# Altium footprint library WE-SHC.PcbLib: 139 footprints (part 3 of 10)
Each footprint in its own frame and in the unit in brackets; x right, y up, seen from the top. Pads: shape width x height; smd on the part's side, far side on the other; paste and mask are expansions set on the pad; w line width, h text height; cw(c..) or ccw(c..) is an arc to the next point about the centre after c.
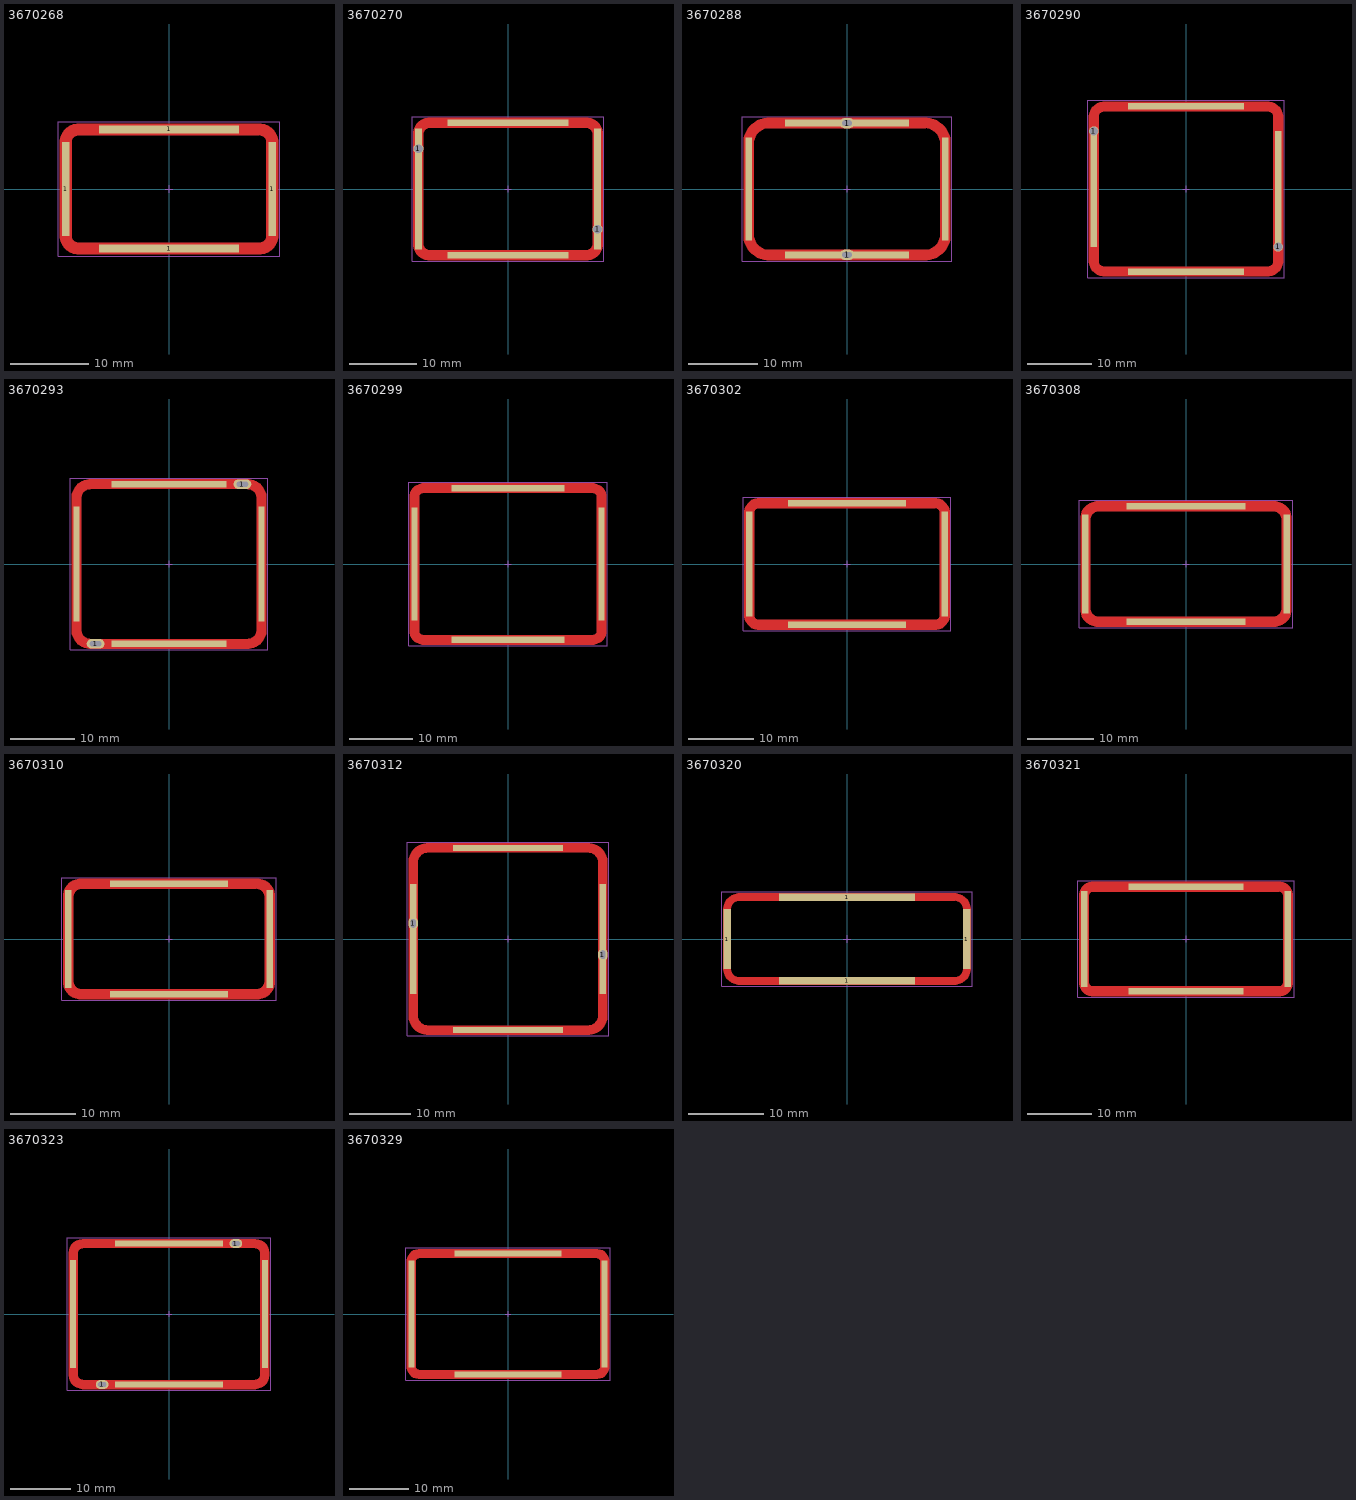
[diagram p2: the footprints below, top view; thin cyan lines are the x and y axes]

## 3670268 [mm] "Shielding Cabinet, SMT Frame Seamless, 26.8x15.6x2.5mm"
height 2.5
pads (4):
  rect 1x12 smd paste-2539.97 mask-2222: 1(-13.25,0) 1(13.25,0)
  rect 18x1 smd paste-2539.97 mask-2222: 1(0,-7.65) 1(0,7.65)
Top Layer:
  region: -14,-0.25 -14,-6 -14,-6.236 -13.908,-6.7 -13.727,-7.137 -13.464,-7.53 -13.13,-7.864 -12.737,-8.127 -12.3,-8.308 -11.836,-8.4 -11.6,-8.4 11.6,-8.4 11.836,-8.4 12.3,-8.308 12.737,-8.127 13.13,-7.864 13.464,-7.53 13.727,-7.137 13.908,-6.7 14,-6.236 14,-6 14,-0.25 12.5,-0.25 12.5,-6 12.496,-6.088 12.461,-6.261 12.394,-6.424 12.296,-6.571 12.171,-6.696 12.024,-6.794 11.861,-6.861 11.688,-6.896 11.6,-6.9 -11.6,-6.9 -11.688,-6.896 -11.861,-6.861 -12.024,-6.794 -12.171,-6.696 -12.296,-6.571 -12.394,-6.424 -12.461,-6.261 -12.496,-6.088 -12.5,-6 -12.5,-0.25
  region: -14,-1 -14,6 -14,6.236 -13.908,6.7 -13.727,7.137 -13.464,7.53 -13.13,7.864 -12.737,8.127 -12.3,8.308 -11.836,8.4 -11.6,8.4 11.6,8.4 11.836,8.4 12.3,8.308 12.737,8.127 13.13,7.864 13.464,7.53 13.727,7.137 13.908,6.7 14,6.236 14,6 14,-1 12.5,-1 12.5,6 12.496,6.088 12.461,6.261 12.394,6.424 12.296,6.571 12.171,6.696 12.024,6.794 11.861,6.861 11.688,6.896 11.6,6.9 -11.6,6.9 -11.688,6.896 -11.861,6.861 -12.024,6.794 -12.171,6.696 -12.296,6.571 -12.394,6.424 -12.461,6.261 -12.496,6.088 -12.5,6 -12.5,-1
Top Paste:
  region: -14,0.25 -14,6 -14,6.236 -13.908,6.7 -13.727,7.137 -13.464,7.53 -13.13,7.864 -12.737,8.127 -12.3,8.308 -11.836,8.4 -11.6,8.4 11.6,8.4 11.836,8.4 12.3,8.308 12.737,8.127 13.13,7.864 13.464,7.53 13.727,7.137 13.908,6.7 14,6.236 14,6 14,0.25 12.5,0.25 12.5,6 12.496,6.088 12.461,6.261 12.394,6.424 12.296,6.571 12.171,6.696 12.024,6.794 11.861,6.861 11.688,6.896 11.6,6.9 -11.6,6.9 -11.688,6.896 -11.861,6.861 -12.024,6.794 -12.171,6.696 -12.296,6.571 -12.394,6.424 -12.461,6.261 -12.496,6.088 -12.5,6 -12.5,0.25
  region: -14,-0.25 -14,-6 -14,-6.236 -13.908,-6.7 -13.727,-7.137 -13.464,-7.53 -13.13,-7.864 -12.737,-8.127 -12.3,-8.308 -11.836,-8.4 -11.6,-8.4 11.6,-8.4 11.836,-8.4 12.3,-8.308 12.737,-8.127 13.13,-7.864 13.464,-7.53 13.727,-7.137 13.908,-6.7 14,-6.236 14,-6 14,-0.25 12.5,-0.25 12.5,-6 12.496,-6.088 12.461,-6.261 12.394,-6.424 12.296,-6.571 12.171,-6.696 12.024,-6.794 11.861,-6.861 11.688,-6.896 11.6,-6.9 -11.6,-6.9 -11.688,-6.896 -11.861,-6.861 -12.024,-6.794 -12.171,-6.696 -12.296,-6.571 -12.394,-6.424 -12.461,-6.261 -12.496,-6.088 -12.5,-6 -12.5,-0.25
Notes:
  text "recommended tin paste thickness=0.5mm / customer to define the final stencil gap" at -5,-10 h0.4
Top Designator:
  text ".Designator" at -7.498,-0.5 h1.5
Top Component Outline:
  lines w0.1: -13.4,-6.05 ccw(c-11.65,-6.05) -11.65,-7.8 11.65,-7.8 ccw(c11.65,-6.05) 13.4,-6.05 13.4,6.05 ccw(c11.65,6.05) 11.65,7.8 -11.65,7.8 ccw(c-11.65,6.05) -13.4,6.05 -13.4,-6.05
Top 3D Body:
  lines w0.1: -13.4,-6.05 ccw(c-11.65,-6.05) -11.65,-7.8 11.65,-7.8 ccw(c11.65,-6.05) 13.4,-6.05 13.4,6.05 ccw(c11.65,6.05) 11.65,7.8 -11.65,7.8 ccw(c-11.65,6.05) -13.4,6.05 -13.4,-6.05
Top Courtyard:
  lines w0.05: -0.5,0 0.5,0 ; 0,-0.5 0,0.5 ; -14.2,-8.6 14.2,-8.6 14.2,8.6 -14.2,8.6 -14.2,-8.6
3D body "3670268.stp": height 2.5, standoff 0, extent -13.4,-7.8 13.4,7.8

## 3670270 [mm] "Shielding Cabinet, SMT Frame Seamless, 27x20x6mm"
height 6
pads (6):
  rect 1x18 smd paste-2539.97 mask-2222: 1(-13.35,0) 1(13.35,0)
  round 1.5 hole 1.3: 1(-13.35,6) 1(13.35,-6)
  rect 18x1 smd paste-2539.97 mask-2222: 1(0,-9.85) 1(0,9.85)
Top Layer:
  region: -14.1,-8.2 -14.1,8.2 -14.1,8.436 -14.008,8.9 -13.827,9.337 -13.564,9.73 -13.23,10.064 -12.837,10.327 -12.4,10.508 -11.936,10.6 -11.7,10.6 1,10.6 1,9.1 -11.7,9.1 -11.788,9.096 -11.961,9.061 -12.124,8.994 -12.271,8.896 -12.396,8.771 -12.494,8.624 -12.561,8.461 -12.596,8.288 -12.6,8.2 -12.6,-8.2 -12.596,-8.288 -12.561,-8.461 -12.494,-8.624 -12.396,-8.771 -12.271,-8.896 -12.124,-8.994 -11.961,-9.061 -11.788,-9.096 -11.7,-9.1 1,-9.1 1,-10.6 -11.7,-10.6 -11.936,-10.6 -12.4,-10.508 -12.837,-10.327 -13.23,-10.064 -13.564,-9.73 -13.827,-9.337 -14.008,-8.9 -14.1,-8.436
  region: 14.1,-8.2 14.1,8.2 14.1,8.436 14.008,8.9 13.827,9.337 13.564,9.73 13.23,10.064 12.837,10.327 12.4,10.508 11.936,10.6 11.7,10.6 0.25,10.6 0.25,9.1 11.7,9.1 11.788,9.096 11.961,9.061 12.124,8.994 12.271,8.896 12.396,8.771 12.494,8.624 12.561,8.461 12.596,8.288 12.6,8.2 12.6,-8.2 12.596,-8.288 12.561,-8.461 12.494,-8.624 12.396,-8.771 12.271,-8.896 12.124,-8.994 11.961,-9.061 11.788,-9.096 11.7,-9.1 0.25,-9.1 0.25,-10.6 11.7,-10.6 11.936,-10.6 12.4,-10.508 12.837,-10.327 13.23,-10.064 13.564,-9.73 13.827,-9.337 14.008,-8.9 14.1,-8.436
Top Paste:
  region: 14.1,-8.2 14.1,8.2 14.1,8.436 14.008,8.9 13.827,9.337 13.564,9.73 13.23,10.064 12.837,10.327 12.4,10.508 11.936,10.6 11.7,10.6 0.25,10.6 0.25,9.1 11.7,9.1 11.788,9.096 11.961,9.061 12.124,8.994 12.271,8.896 12.396,8.771 12.494,8.624 12.561,8.461 12.596,8.288 12.6,8.2 12.6,-8.2 12.596,-8.288 12.561,-8.461 12.494,-8.624 12.396,-8.771 12.271,-8.896 12.124,-8.994 11.961,-9.061 11.788,-9.096 11.7,-9.1 0.25,-9.1 0.25,-10.6 11.7,-10.6 11.936,-10.6 12.4,-10.508 12.837,-10.327 13.23,-10.064 13.564,-9.73 13.827,-9.337 14.008,-8.9 14.1,-8.436
  region: -14.1,-8.2 -14.1,8.2 -14.1,8.436 -14.008,8.9 -13.827,9.337 -13.564,9.73 -13.23,10.064 -12.837,10.327 -12.4,10.508 -11.936,10.6 -11.7,10.6 -0.25,10.6 -0.25,9.1 -11.7,9.1 -11.788,9.096 -11.961,9.061 -12.124,8.994 -12.271,8.896 -12.396,8.771 -12.494,8.624 -12.561,8.461 -12.596,8.288 -12.6,8.2 -12.6,-8.2 -12.596,-8.288 -12.561,-8.461 -12.494,-8.624 -12.396,-8.771 -12.271,-8.896 -12.124,-8.994 -11.961,-9.061 -11.788,-9.096 -11.7,-9.1 -0.25,-9.1 -0.25,-10.6 -11.7,-10.6 -11.936,-10.6 -12.4,-10.508 -12.837,-10.327 -13.23,-10.064 -13.564,-9.73 -13.827,-9.337 -14.008,-8.9 -14.1,-8.436
Notes:
  text "recommended tin paste thickness=0.5mm / customer to define the final stencil gap" at -5.6,-12.2 h0.4
Top Designator:
  text ".Designator" at -7.498,-0.5 h1.5
Top Component Outline:
  lines w0.1: -13.5,-8.25 ccw(c-11.75,-8.25) -11.75,-10 11.75,-10 ccw(c11.75,-8.25) 13.5,-8.25 13.5,8.25 ccw(c11.75,8.25) 11.75,10 -11.75,10 ccw(c-11.75,8.25) -13.5,8.25 -13.5,-8.25
Top 3D Body:
  lines w0.1: -13.5,-8.25 ccw(c-11.75,-8.25) -11.75,-10 11.75,-10 ccw(c11.75,-8.25) 13.5,-8.25 13.5,8.25 ccw(c11.75,8.25) 11.75,10 -11.75,10 ccw(c-11.75,8.25) -13.5,8.25 -13.5,-8.25
Top Courtyard:
  lines w0.05: -0.5,0 0.5,0 ; 0,-0.5 0,0.5 ; -14.3,-10.8 -14.3,10.8 14.3,10.8 14.3,-10.8 -14.3,-10.8
3D body "3670270.stp": height 6, standoff -1, extent -13.5,-10 13.5,10

## 3670288 [mm] "Shielding Cabinet, SMT Frame Seamless, 28.8x19.4x5mm"
height 5
pads (6):
  rect 1x15 smd paste-2539.97 mask-2222: 1(-14.25,0) 1(14.25,0)
  rect 18x1 smd paste-2539.97 mask-2222: 1(0,-9.55) 1(0,9.55)
  oval 2.1x1.5 hole 0.8 slot 1.4 at 0 deg: 1(0,-9.55) 1(0,9.55)
Top Layer:
  region: -15,-0.25 -15,-6.7 -15,-6.936 -14.938,-7.404 -14.816,-7.86 -14.636,-8.296 -14.4,-8.704 -14.112,-9.079 -13.779,-9.412 -13.404,-9.7 -12.996,-9.936 -12.56,-10.116 -12.104,-10.238 -11.636,-10.3 -11.4,-10.3 11.4,-10.3 11.636,-10.3 12.104,-10.238 12.56,-10.116 12.996,-9.936 13.404,-9.7 13.779,-9.412 14.112,-9.079 14.4,-8.704 14.636,-8.296 14.816,-7.86 14.938,-7.404 15,-6.936 15,-6.7 15,-0.25 13.5,-0.25 13.5,-6.7 13.49,-6.906 13.41,-7.31 13.252,-7.69 13.023,-8.032 12.732,-8.323 12.39,-8.552 12.01,-8.71 11.606,-8.79 11.4,-8.8 -11.4,-8.8 -11.606,-8.79 -12.01,-8.71 -12.39,-8.552 -12.732,-8.323 -13.023,-8.032 -13.252,-7.69 -13.41,-7.31 -13.49,-6.906 -13.5,-6.7 -13.5,-0.25
  region: -15,-1 -15,6.7 -15,6.936 -14.938,7.404 -14.816,7.86 -14.636,8.296 -14.4,8.704 -14.112,9.079 -13.779,9.412 -13.404,9.7 -12.996,9.936 -12.56,10.116 -12.104,10.238 -11.636,10.3 -11.4,10.3 11.4,10.3 11.636,10.3 12.104,10.238 12.56,10.116 12.996,9.936 13.404,9.7 13.779,9.412 14.112,9.079 14.4,8.704 14.636,8.296 14.816,7.86 14.938,7.404 15,6.936 15,6.7 15,-1 13.5,-1 13.5,6.7 13.49,6.906 13.41,7.31 13.252,7.69 13.023,8.032 12.732,8.323 12.39,8.552 12.01,8.71 11.606,8.79 11.4,8.8 -11.4,8.8 -11.606,8.79 -12.01,8.71 -12.39,8.552 -12.732,8.323 -13.023,8.032 -13.252,7.69 -13.41,7.31 -13.49,6.906 -13.5,6.7 -13.5,-1
Top Paste:
  region: -15,0.25 -15,6.7 -15,6.936 -14.938,7.404 -14.816,7.86 -14.636,8.296 -14.4,8.704 -14.112,9.079 -13.779,9.412 -13.404,9.7 -12.996,9.936 -12.56,10.116 -12.104,10.238 -11.636,10.3 -11.4,10.3 11.4,10.3 11.636,10.3 12.104,10.238 12.56,10.116 12.996,9.936 13.404,9.7 13.779,9.412 14.112,9.079 14.4,8.704 14.636,8.296 14.816,7.86 14.938,7.404 15,6.936 15,6.7 15,0.25 13.5,0.25 13.5,6.7 13.49,6.906 13.41,7.31 13.252,7.69 13.023,8.032 12.732,8.323 12.39,8.552 12.01,8.71 11.606,8.79 11.4,8.8 -11.4,8.8 -11.606,8.79 -12.01,8.71 -12.39,8.552 -12.732,8.323 -13.023,8.032 -13.252,7.69 -13.41,7.31 -13.49,6.906 -13.5,6.7 -13.5,0.25
  region: -15,-0.25 -15,-6.7 -15,-6.936 -14.938,-7.404 -14.816,-7.86 -14.636,-8.296 -14.4,-8.704 -14.112,-9.079 -13.779,-9.412 -13.404,-9.7 -12.996,-9.936 -12.56,-10.116 -12.104,-10.238 -11.636,-10.3 -11.4,-10.3 11.4,-10.3 11.636,-10.3 12.104,-10.238 12.56,-10.116 12.996,-9.936 13.404,-9.7 13.779,-9.412 14.112,-9.079 14.4,-8.704 14.636,-8.296 14.816,-7.86 14.938,-7.404 15,-6.936 15,-6.7 15,-0.25 13.5,-0.25 13.5,-6.7 13.49,-6.906 13.41,-7.31 13.252,-7.69 13.023,-8.032 12.732,-8.323 12.39,-8.552 12.01,-8.71 11.606,-8.79 11.4,-8.8 -11.4,-8.8 -11.606,-8.79 -12.01,-8.71 -12.39,-8.552 -12.732,-8.323 -13.023,-8.032 -13.252,-7.69 -13.41,-7.31 -13.49,-6.906 -13.5,-6.7 -13.5,-0.25
Notes:
  text "recommended tin paste thickness=0.5mm / customer to define the final stencil gap" at -5.6,-12.2 h0.4
Top Designator:
  text ".Designator" at -7.498,-0.5 h1.5
Top Component Outline:
  lines w0.1: -14.4,-6.7 ccw(c-11.4,-6.7) -11.4,-9.7 11.4,-9.7 ccw(c11.4,-6.7) 14.4,-6.7 14.4,6.7 ccw(c11.4,6.7) 11.4,9.7 -11.4,9.7 ccw(c-11.4,6.7) -14.4,6.7 -14.4,-6.7
Top 3D Body:
  lines w0.1: -14.4,-6.7 ccw(c-11.4,-6.7) -11.4,-9.7 11.4,-9.7 ccw(c11.4,-6.7) 14.4,-6.7 14.4,6.7 ccw(c11.4,6.7) 11.4,9.7 -11.4,9.7 ccw(c-11.4,6.7) -14.4,6.7 -14.4,-6.7
Top Courtyard:
  lines w0.05: -0.5,0 0.5,0 ; 0,-0.5 0,0.5 ; -15.2,-10.5 -15.2,10.5 15.2,10.5 15.2,-10.5 -15.2,-10.5
3D body "3670288.stp": height 5, standoff -0.6, extent -14.4,-9.7 14.4,9.7

## 3670290 [mm] "Shielding Cabinet, SMT Frame Seamless, 29x26x3mm"
height 3
pads (6):
  rect 1x18 smd paste-2539.97 mask-2222: 1(-14.35,0) 1(14.35,0)
  round 1.5 hole 1.3: 1(-14.35,9) 1(14.35,-9)
  rect 18x1 smd paste-2539.97 mask-2222: 1(0,-12.85) 1(0,12.85)
Top Layer:
  region: 15.1,-11.2 15.1,11.2 15.1,11.436 15.008,11.9 14.827,12.337 14.564,12.73 14.23,13.064 13.837,13.327 13.4,13.508 12.936,13.6 12.7,13.6 0.25,13.6 0.25,12.1 12.7,12.1 12.788,12.096 12.961,12.061 13.124,11.994 13.271,11.896 13.396,11.771 13.494,11.624 13.561,11.461 13.596,11.288 13.6,11.2 13.6,-11.2 13.596,-11.288 13.561,-11.461 13.494,-11.624 13.396,-11.771 13.271,-11.896 13.124,-11.994 12.961,-12.061 12.788,-12.096 12.7,-12.1 0.25,-12.1 0.25,-13.6 12.7,-13.6 12.936,-13.6 13.4,-13.508 13.837,-13.327 14.23,-13.064 14.564,-12.73 14.827,-12.337 15.008,-11.9 15.1,-11.436
  region: -15.1,-11.2 -15.1,11.2 -15.1,11.436 -15.008,11.9 -14.827,12.337 -14.564,12.73 -14.23,13.064 -13.837,13.327 -13.4,13.508 -12.936,13.6 -12.7,13.6 0.9,13.6 0.9,12.1 -12.7,12.1 -12.788,12.096 -12.961,12.061 -13.124,11.994 -13.271,11.896 -13.396,11.771 -13.494,11.624 -13.561,11.461 -13.596,11.288 -13.6,11.2 -13.6,-11.2 -13.596,-11.288 -13.561,-11.461 -13.494,-11.624 -13.396,-11.771 -13.271,-11.896 -13.124,-11.994 -12.961,-12.061 -12.788,-12.096 -12.7,-12.1 0.9,-12.1 0.9,-13.6 -12.7,-13.6 -12.936,-13.6 -13.4,-13.508 -13.837,-13.327 -14.23,-13.064 -14.564,-12.73 -14.827,-12.337 -15.008,-11.9 -15.1,-11.436
Top Paste:
  region: -15.1,-11.2 -15.1,11.2 -15.1,11.436 -15.008,11.9 -14.827,12.337 -14.564,12.73 -14.23,13.064 -13.837,13.327 -13.4,13.508 -12.936,13.6 -12.7,13.6 -0.25,13.6 -0.25,12.1 -12.7,12.1 -12.788,12.096 -12.961,12.061 -13.124,11.994 -13.271,11.896 -13.396,11.771 -13.494,11.624 -13.561,11.461 -13.596,11.288 -13.6,11.2 -13.6,-11.2 -13.596,-11.288 -13.561,-11.461 -13.494,-11.624 -13.396,-11.771 -13.271,-11.896 -13.124,-11.994 -12.961,-12.061 -12.788,-12.096 -12.7,-12.1 -0.25,-12.1 -0.25,-13.6 -12.7,-13.6 -12.936,-13.6 -13.4,-13.508 -13.837,-13.327 -14.23,-13.064 -14.564,-12.73 -14.827,-12.337 -15.008,-11.9 -15.1,-11.436
  region: 15.1,-11.2 15.1,11.2 15.1,11.436 15.008,11.9 14.827,12.337 14.564,12.73 14.23,13.064 13.837,13.327 13.4,13.508 12.936,13.6 12.7,13.6 0.25,13.6 0.25,12.1 12.7,12.1 12.788,12.096 12.961,12.061 13.124,11.994 13.271,11.896 13.396,11.771 13.494,11.624 13.561,11.461 13.596,11.288 13.6,11.2 13.6,-11.2 13.596,-11.288 13.561,-11.461 13.494,-11.624 13.396,-11.771 13.271,-11.896 13.124,-11.994 12.961,-12.061 12.788,-12.096 12.7,-12.1 0.25,-12.1 0.25,-13.6 12.7,-13.6 12.936,-13.6 13.4,-13.508 13.837,-13.327 14.23,-13.064 14.564,-12.73 14.827,-12.337 15.008,-11.9 15.1,-11.436
Notes:
  text "recommended tin paste thickness=0.5mm / customer to define the final stencil gap" at -5.55,-15.25 h0.4
Top Designator:
  text ".Designator" at -7.498,-0.5 h1.5
Top Component Outline:
  lines w0.1: -14.5,-11.25 ccw(c-12.75,-11.25) -12.75,-13 12.75,-13 ccw(c12.75,-11.25) 14.5,-11.25 14.5,11.25 ccw(c12.75,11.25) 12.75,13 -12.75,13 ccw(c-12.75,11.25) -14.5,11.25 -14.5,-11.25
Top 3D Body:
  lines w0.1: -14.5,-11.25 ccw(c-12.75,-11.25) -12.75,-13 12.75,-13 ccw(c12.75,-11.25) 14.5,-11.25 14.5,11.25 ccw(c12.75,11.25) 12.75,13 -12.75,13 ccw(c-12.75,11.25) -14.5,11.25 -14.5,-11.25
Top Courtyard:
  lines w0.05: -0.5,0 0.5,0 ; 0,-0.5 0,0.5 ; -15.3,-13.8 15.3,-13.8 15.3,13.8 -15.3,13.8 -15.3,-13.8
3D body "3670290.stp": height 3, standoff -1, extent -14.5,-13 14.5,13

## 3670293 [mm] "Shielding Cabinet, SMT Frame Seamless, 29.3x25.3x6.4mm"
height 6.4
pads (6):
  rect 1x18 smd paste-2539.97 mask-2222: 1(-14.5,0) 1(14.5,0)
  oval 2.8x1.5 hole 0.8 slot 1.8 at 0 deg: 1(-11.5,-12.5) 1(11.5,12.5)
  rect 18x1 smd paste-2539.97 mask-2222: 1(0,-12.5) 1(0,12.5)
Top Layer:
  region: -15.25,-1 -15.25,10.35 -15.25,10.54 -15.2,10.917 -15.102,11.284 -14.957,11.635 -14.766,11.965 -14.535,12.266 -14.266,12.535 -13.965,12.766 -13.635,12.957 -13.284,13.102 -12.917,13.2 -12.54,13.25 -12.35,13.25 12.35,13.25 12.54,13.25 12.917,13.2 13.284,13.102 13.635,12.957 13.965,12.766 14.266,12.535 14.535,12.266 14.766,11.965 14.957,11.635 15.102,11.284 15.2,10.917 15.25,10.54 15.25,10.35 15.25,-1 13.75,-1 13.75,10.3 13.743,10.442 13.688,10.721 13.579,10.984 13.421,11.22 13.22,11.421 12.984,11.579 12.721,11.688 12.442,11.743 12.3,11.75 -12.3,11.75 -12.442,11.743 -12.721,11.688 -12.984,11.579 -13.22,11.421 -13.421,11.22 -13.579,10.984 -13.688,10.721 -13.743,10.442 -13.75,10.3 -13.75,-1
  region: -15.25,-0.25 -15.25,-10.35 -15.25,-10.54 -15.2,-10.917 -15.102,-11.284 -14.957,-11.635 -14.766,-11.965 -14.535,-12.266 -14.266,-12.535 -13.965,-12.766 -13.635,-12.957 -13.284,-13.102 -12.917,-13.2 -12.54,-13.25 -12.35,-13.25 12.35,-13.25 12.54,-13.25 12.917,-13.2 13.284,-13.102 13.635,-12.957 13.965,-12.766 14.266,-12.535 14.535,-12.266 14.766,-11.965 14.957,-11.635 15.102,-11.284 15.2,-10.917 15.25,-10.54 15.25,-10.35 15.25,-0.25 13.75,-0.25 13.75,-10.3 13.743,-10.442 13.688,-10.721 13.579,-10.984 13.421,-11.22 13.22,-11.421 12.984,-11.579 12.721,-11.688 12.442,-11.743 12.3,-11.75 -12.3,-11.75 -12.442,-11.743 -12.721,-11.688 -12.984,-11.579 -13.22,-11.421 -13.421,-11.22 -13.579,-10.984 -13.688,-10.721 -13.743,-10.442 -13.75,-10.3 -13.75,-0.25
Top Paste:
  region: -15.25,-0.25 -15.25,-10.35 -15.25,-10.54 -15.2,-10.917 -15.102,-11.284 -14.957,-11.635 -14.766,-11.965 -14.535,-12.266 -14.266,-12.535 -13.965,-12.766 -13.635,-12.957 -13.284,-13.102 -12.917,-13.2 -12.54,-13.25 -12.35,-13.25 12.35,-13.25 12.54,-13.25 12.917,-13.2 13.284,-13.102 13.635,-12.957 13.965,-12.766 14.266,-12.535 14.535,-12.266 14.766,-11.965 14.957,-11.635 15.102,-11.284 15.2,-10.917 15.25,-10.54 15.25,-10.35 15.25,-0.25 13.75,-0.25 13.75,-10.3 13.743,-10.442 13.688,-10.721 13.579,-10.984 13.421,-11.22 13.22,-11.421 12.984,-11.579 12.721,-11.688 12.442,-11.743 12.3,-11.75 -12.3,-11.75 -12.442,-11.743 -12.721,-11.688 -12.984,-11.579 -13.22,-11.421 -13.421,-11.22 -13.579,-10.984 -13.688,-10.721 -13.743,-10.442 -13.75,-10.3 -13.75,-0.25
  region: -15.25,0.25 -15.25,10.35 -15.25,10.54 -15.2,10.917 -15.102,11.284 -14.957,11.635 -14.766,11.965 -14.535,12.266 -14.266,12.535 -13.965,12.766 -13.635,12.957 -13.284,13.102 -12.917,13.2 -12.54,13.25 -12.35,13.25 12.35,13.25 12.54,13.25 12.917,13.2 13.284,13.102 13.635,12.957 13.965,12.766 14.266,12.535 14.535,12.266 14.766,11.965 14.957,11.635 15.102,11.284 15.2,10.917 15.25,10.54 15.25,10.35 15.25,0.25 13.75,0.25 13.75,10.3 13.743,10.442 13.688,10.721 13.579,10.984 13.421,11.22 13.22,11.421 12.984,11.579 12.721,11.688 12.442,11.743 12.3,11.75 -12.3,11.75 -12.442,11.743 -12.721,11.688 -12.984,11.579 -13.22,11.421 -13.421,11.22 -13.579,10.984 -13.688,10.721 -13.743,10.442 -13.75,10.3 -13.75,0.25
Notes:
  text "recommended tin paste thickness=0.5mm / customer to define the final stencil gap" at -5.7,-14.8 h0.4
Top Designator:
  text ".Designator" at -7.498,-0.5 h1.5
Top Component Outline:
  lines w0.1: -14.65,-10.4 ccw(c-12.4,-10.4) -12.4,-12.65 12.4,-12.65 ccw(c12.4,-10.4) 14.65,-10.4 14.65,10.4 ccw(c12.4,10.4) 12.4,12.65 -12.4,12.65 ccw(c-12.4,10.4) -14.65,10.4 -14.65,-10.4
Top 3D Body:
  lines w0.1: -14.65,-10.4 ccw(c-12.4,-10.4) -12.4,-12.65 12.4,-12.65 ccw(c12.4,-10.4) 14.65,-10.4 14.65,10.4 ccw(c12.4,10.4) 12.4,12.65 -12.4,12.65 ccw(c-12.4,10.4) -14.65,10.4 -14.65,-10.4
Top Courtyard:
  lines w0.05: -0.5,0 0.5,0 ; 0,-0.5 0,0.5 ; -15.45,-13.45 15.45,-13.45 15.45,13.45 -15.45,13.45 -15.45,-13.45
3D body "3670293.stp": height 6.4, standoff -1, extent -14.65,-12.65 14.65,12.65

## 3670299 [mm] "Shielding Cabinet, SMT Frame Seamless, 30x24.4x3.5mm"
height 3.5
pads (4):
  rect 1x18 smd paste-2539.97 mask-2222: 1(-14.85,0) 1(14.85,0)
  rect 18x1 smd paste-2539.97 mask-2222: 1(0,-12.05) 1(0,12.05)
Top Layer:
  region: -15.6,-1 -15.6,10.7 -15.6,10.907 -15.519,11.313 -15.361,11.695 -15.131,12.039 -14.839,12.331 -14.495,12.561 -14.113,12.719 -13.707,12.8 -13.5,12.8 13.5,12.8 13.707,12.8 14.113,12.719 14.495,12.561 14.839,12.331 15.131,12.039 15.361,11.695 15.519,11.313 15.6,10.907 15.6,10.7 15.6,-1 14.1,-1 14.1,10.7 14.088,10.817 13.999,11.033 13.833,11.199 13.617,11.288 13.5,11.3 -13.5,11.3 -13.617,11.288 -13.833,11.199 -13.999,11.033 -14.088,10.817 -14.1,10.7 -14.1,-1
  region: -15.6,-0.25 -15.6,-10.7 -15.6,-10.907 -15.519,-11.313 -15.361,-11.695 -15.131,-12.039 -14.839,-12.331 -14.495,-12.561 -14.113,-12.719 -13.707,-12.8 -13.5,-12.8 13.5,-12.8 13.707,-12.8 14.113,-12.719 14.495,-12.561 14.839,-12.331 15.131,-12.039 15.361,-11.695 15.519,-11.313 15.6,-10.907 15.6,-10.7 15.6,-0.25 14.1,-0.25 14.1,-10.7 14.088,-10.817 13.999,-11.033 13.833,-11.199 13.617,-11.288 13.5,-11.3 -13.5,-11.3 -13.617,-11.288 -13.833,-11.199 -13.999,-11.033 -14.088,-10.817 -14.1,-10.7 -14.1,-0.25
Top Paste:
  region: -15.6,-0.25 -15.6,-10.7 -15.6,-10.907 -15.519,-11.313 -15.361,-11.695 -15.131,-12.039 -14.839,-12.331 -14.495,-12.561 -14.113,-12.719 -13.707,-12.8 -13.5,-12.8 13.5,-12.8 13.707,-12.8 14.113,-12.719 14.495,-12.561 14.839,-12.331 15.131,-12.039 15.361,-11.695 15.519,-11.313 15.6,-10.907 15.6,-10.7 15.6,-0.25 14.1,-0.25 14.1,-10.7 14.088,-10.817 13.999,-11.033 13.833,-11.199 13.617,-11.288 13.5,-11.3 -13.5,-11.3 -13.617,-11.288 -13.833,-11.199 -13.999,-11.033 -14.088,-10.817 -14.1,-10.7 -14.1,-0.25
  region: -15.6,0.25 -15.6,10.7 -15.6,10.907 -15.519,11.313 -15.361,11.695 -15.131,12.039 -14.839,12.331 -14.495,12.561 -14.113,12.719 -13.707,12.8 -13.5,12.8 13.5,12.8 13.707,12.8 14.113,12.719 14.495,12.561 14.839,12.331 15.131,12.039 15.361,11.695 15.519,11.313 15.6,10.907 15.6,10.7 15.6,0.25 14.1,0.25 14.1,10.7 14.088,10.817 13.999,11.033 13.833,11.199 13.617,11.288 13.5,11.3 -13.5,11.3 -13.617,11.288 -13.833,11.199 -13.999,11.033 -14.088,10.817 -14.1,10.7 -14.1,0.25
Notes:
  text "recommended tin paste thickness=0.5mm / customer to define the final stencil gap" at -5.75,-14.45 h0.4
Top Designator:
  text ".Designator" at -7.498,-0.5 h1.5
Top Component Outline:
  lines w0.1: -15,-10.7 ccw(c-13.5,-10.7) -13.5,-12.2 13.5,-12.2 ccw(c13.5,-10.7) 15,-10.7 15,10.7 ccw(c13.5,10.7) 13.5,12.2 -13.5,12.2 ccw(c-13.5,10.7) -15,10.7 -15,-10.7
Top 3D Body:
  lines w0.1: -15,-10.7 ccw(c-13.5,-10.7) -13.5,-12.2 13.5,-12.2 ccw(c13.5,-10.7) 15,-10.7 15,10.7 ccw(c13.5,10.7) 13.5,12.2 -13.5,12.2 ccw(c-13.5,10.7) -15,10.7 -15,-10.7
Top Courtyard:
  lines w0.05: -0.5,0 0.5,0 ; 0,-0.5 0,0.5 ; -15.8,-13 -15.8,13 15.8,13 15.8,-13 -15.8,-13
3D body "3670299.stp": height 3.5, standoff 0, extent -15,-12.2 15,12.2
